# Altium footprint library Caps.PcbLib: 75 footprints (part 3 of 5)
Each footprint in its own frame and in the unit in brackets; x right, y up, seen from the top. Pads: shape width x height; smd on the part's side, far side on the other; paste and mask are expansions set on the pad; w line width, h text height; cw(c..) or ccw(c..) is an arc to the next point about the centre after c.
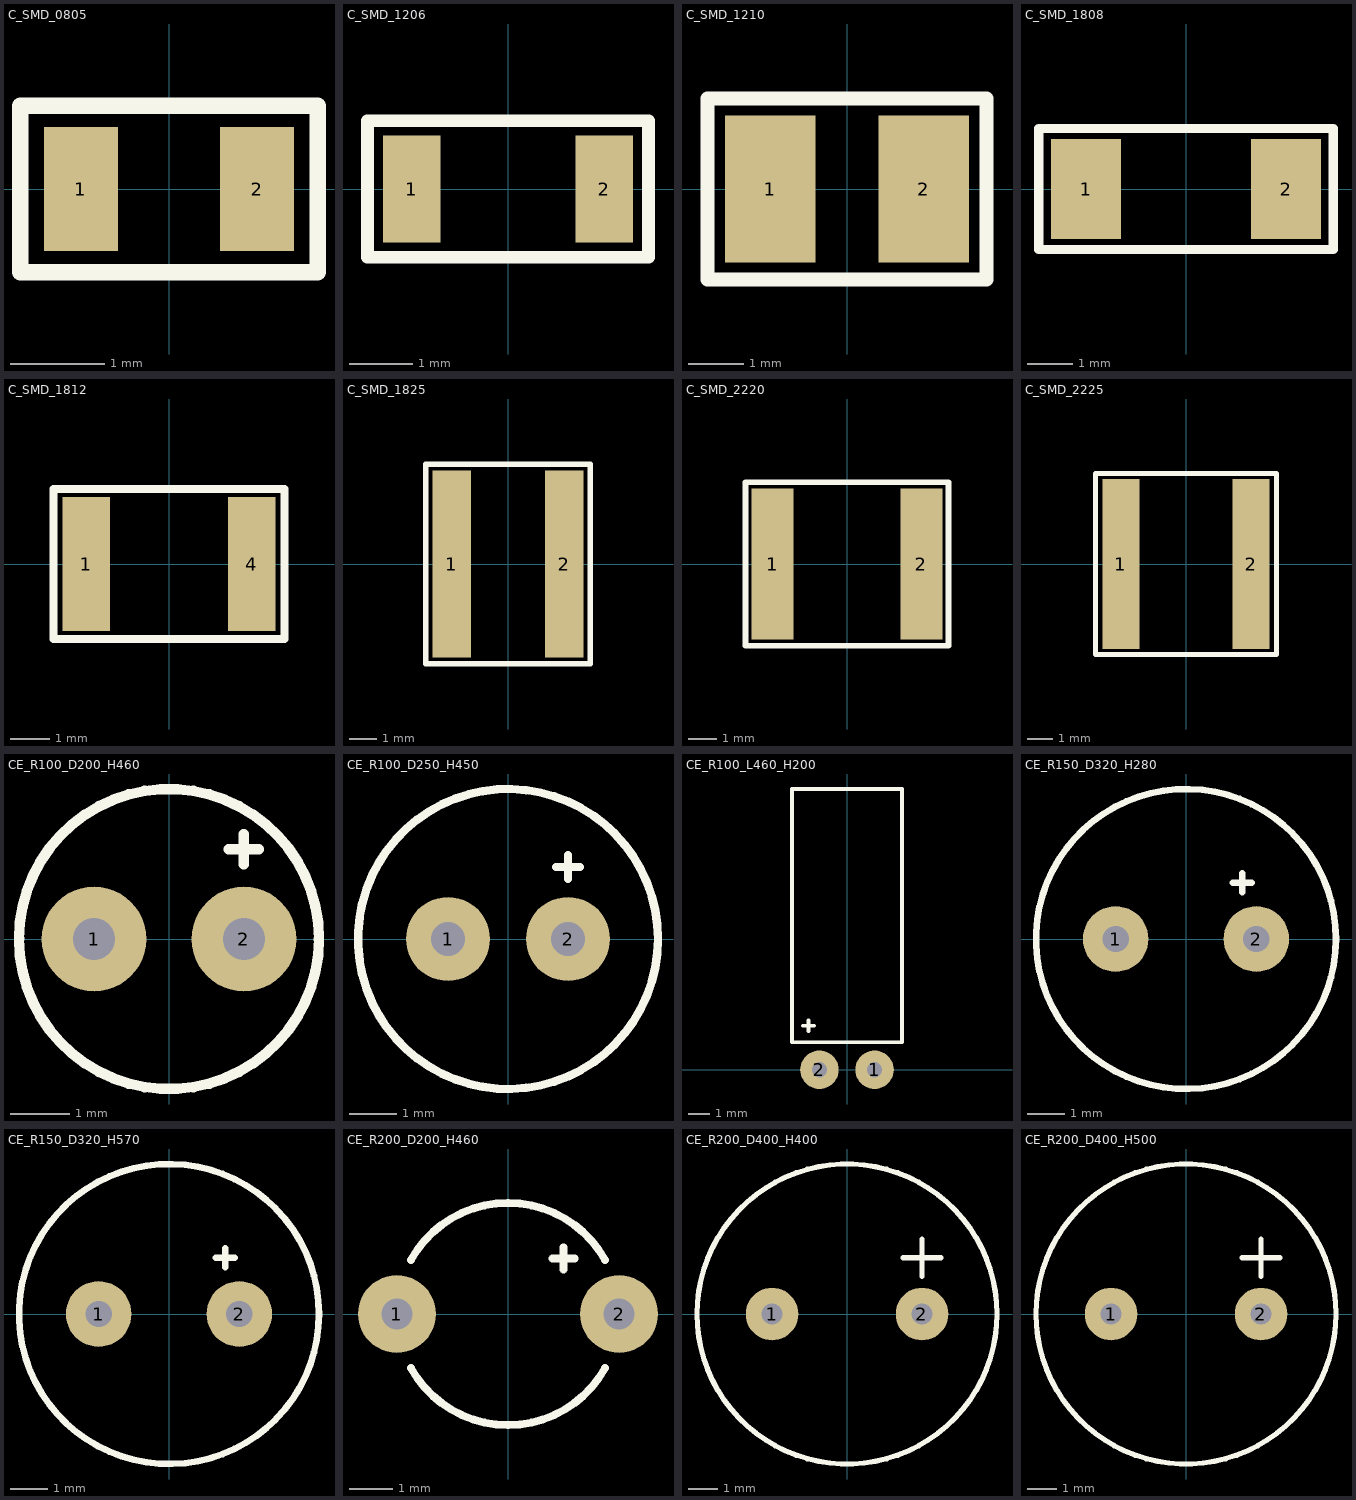
[diagram p2: the footprints below, top view; thin cyan lines are the x and y axes]

## C_SMD_0805 [mil] "Metric Size - 2012"
height 39.37
pads (2):
  rect 31x52 smd: 1(-37,0) 2(37,0)
Top Overlay:
  lines w7: -62.5,-35 -62.5,35 62.5,35 62.5,-35 -62.5,-35
3D body "Cap_SMD_0805.SLDPRT": height 30, standoff 0, extent -39.99,-24.99 40.01,25

## C_SMD_1206 [mil] "Metric Size - 3216"
height 39.37
pads (2):
  rect 36x67 smd: 1(-60,0) 2(60,0)
Top Overlay:
  lines w8: -87.5,-42.5 87.5,-42.5 87.5,42.5 85,42.5 -87.5,42.5 -87.5,-42.5
3D body "Cap_SMD_1206.SLDPRT": height 39.37, standoff 0, extent -62.99,-31.5 62.99,31.5

## C_SMD_1210 [mil] "Metric Size - 3225"
height 39.37
pads (2):
  rect 65x105 smd: 1(-55,0) 2(55,0)
Top Overlay:
  lines w10: -100,-65 -100,65 100,65 100,-65 -100,-65
3D body "Cap_SMD_1210.SLDPRT": height 39.37, standoff 0, extent -62.99,-49.21 63,49.22

## C_SMD_1808 [mm] "Metric Size - 4520"
height 2
pads (2):
  rect 1.55x2.2 smd: 1(-2.2,0) 2(2.2,0)
Top Overlay:
  lines w0.203: -3.238,-1.333 -3.238,1.333 3.238,1.333 3.238,-1.333 -3.238,-1.333
3D body "Cap_SMD_1808.SLDPRT": height 1.6, standoff 0, extent -2.35,-1 2.35,1

## C_SMD_1812 [mm] "Metric Size - 4532"
height 2
pads (2):
  rect 1.2x3.4 smd: 1(-2.1,0) 4(2.1,0)
Top Overlay:
  lines w0.203: -2.921,-1.905 -2.921,1.905 2.921,1.905 2.921,-1.905 -2.921,-1.905
3D body "Cap_SMD_1812.SLDPRT": height 1.8, standoff 0, extent -2.25,-1.6 2.25,1.6

## C_SMD_1825 [mm] "Metric Size - 4564"
height 3
pads (2):
  rect 1.4x6.8 smd: 1(-2.05,0) 2(2.05,0)
Top Overlay:
  lines w0.203: -2.984,-3.619 -2.984,3.619 2.984,3.619 2.984,-3.619 -2.984,-3.619
3D body "Cap_SMD_1825.SLDPRT": height 2.4, standoff 0, extent -2.25,-3.2 2.25,3.2

## C_SMD_2220 [mm] "Metric Size - 5650"
height 3
pads (2):
  rect 1.5x5.4 smd: 1(-2.65,0) 2(2.65,0)
Top Overlay:
  lines w0.203: -3.619,-2.921 -3.619,2.921 3.619,2.921 3.619,-2.921 -3.619,-2.921
3D body "Cap_SMD_2220.SLDPRT": height 2.5, standoff 0, extent -2.85,-2.5 2.85,2.5

## C_SMD_2225 [mm] "Metric Size - 5664"
height 3
pads (2):
  rect 1.5x6.8 smd: 1(-2.6,0) 2(2.6,0)
Top Overlay:
  lines w0.203: -3.619,-3.619 3.619,-3.619 3.619,3.619 -3.619,3.619 -3.619,-3.619
3D body "Cap_SMD_2225.SLDPRT": height 3, standoff 0, extent -2.8,-3.2 2.8,3.2

## CE_R100_D200_H460 [mil] "Raster=100mils, Diam=200mils, Hight=460mils"
height 500
pads (2):
  round 70 hole 28: 1(-50,0) 2(50,0)
Top Overlay:
  circle w7: c0,0 r100
  lines w7: 40,60 60,60 ; 50,50 50,70
3D body "CE_R100_D200_H460.STEP": height 535.63, standoff -58.86, extent -99.92,-99.98 100,99.98

## CE_R100_D250_H450 [mil]
height 450
pads (2):
  round 70 hole 28: 1(-50,0) 2(50,0)
Top Overlay:
  circle w7: c0,0 r125
  lines w7: 40,60 60,60 ; 50,50 50,70
3D body "CE_R100_D200_H460.STEP": height 535.63, standoff -58.86, extent -99.92,-99.98 100,99.98

## CE_R100_L460_H200 [mil] "Raster=100, Lenght=460, Hight=200 - Poziomy"
height 200
pads (2):
  round 70 hole 28: 1(50,0) 2(-50,0)
Top Overlay:
  lines w7: -80,80 -60,80 ; -70,70 -70,90 ; -100,50 100,50 100,510 -100,510 -100,50
3D body "CE_R100_D200_H460.STEP": height 174.98, standoff -24.98, extent -99.96,-84.49 99.96,510

## CE_R150_D320_H280 [mil] "Raster=150mils, Dia=320mils, Hight=280mils"
height 300
pads (2):
  round 70 hole 28: 1(-75,0) 2(75,0)
Top Overlay:
  circle w7: c0,0 r160
  lines w7: 50,60 70,60 ; 60,50 60,70
3D body "CE_R150_D320_H280.STEP": height 287.46, standoff -82.61, extent -161.41,-160.86 160.37,160.86

## CE_R150_D320_H570 [mil] "Raster=150mils, Dia=320mils, H=570mils"
height 600
pads (2):
  round 70 hole 28: 1(-75,0) 2(75,0)
Top Overlay:
  circle w7: c0,0 r160
  lines w7: 50,60 70,60 ; 60,50 60,70
3D body "CE_R150_D320_H570.STEP": height 566.93, standoff -114.17, extent -161.41,-161.42 161.42,161.42

## CE_R200_D200_H460 [mil] "Raster=200mils, Dia=200mils, Hight=460mils"
height 600
pads (2):
  round 70 hole 28: 1(-100,0) 2(100,0)
Top Overlay:
  lines w7: -87.42,-48.56 ccw(c0,0) 87.42,-48.56 ; -87.42,48.56 cw(c0,0) 87.42,48.56 ; 40,50 60,50 ; 50,40 50,60
3D body "CE_R200_D200_H460.STEP": height 585.63, standoff -67.91, extent -109.84,-100 109.84,99.96

## CE_R200_D400_H400 [mil] "Raster=200mils, Dia=400mils_Hight=400mils"
height 400
pads (2):
  round 70 hole 28: 1(-100,0) 2(100,0)
Top Overlay:
  circle w7: c0,0 r200
  lines w7: 75,75 125,75 ; 100,50 100,100
3D body "CE_R200_D400_H400.STEP": height 400, standoff -90.55, extent -200,-200 199.99,200

## CE_R200_D400_H500 [mil] "Raster=200mils, Dia=400mils, Hight=500mils"
height 500
pads (2):
  round 70 hole 28: 1(-100,0) 2(100,0)
Top Overlay:
  circle w7: c0,0 r200
  lines w7: 75,75 125,75 ; 100,50 100,100
3D body "CE_R200_D400_H500.STEP": height 515, standoff -91.3, extent -199.19,-198.62 199.19,200